# Altium schematic symbol library jlcpcb_2025_04_capacitors_extended_0402.schlib: 3594 symbols (part 13 of 20) (continued)
## GCM1555C1H3R5CA16D (continued)
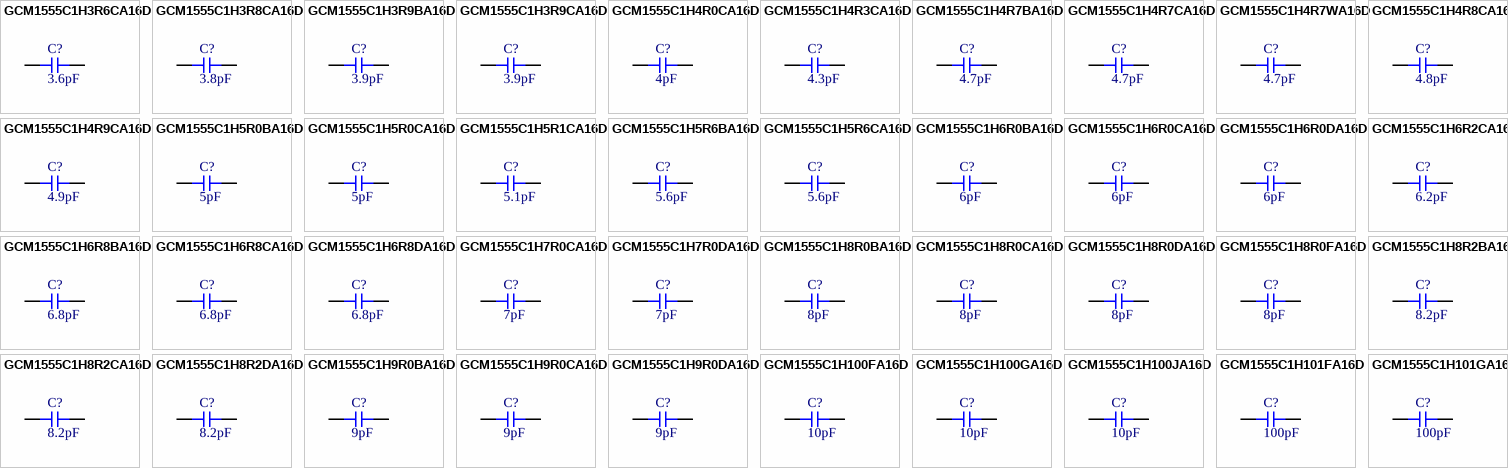
[diagram p58: symbols GCM1555C1H3R6CA16D to GCM1555C1H101GA16D]

## GCM1555C1H3R6CA16D
designator C?  Capacitance: 3.6pF  (hidden comment: *)
Capacitor, Ceramic (MLCC), 3.6pF, 50V, C0G, SMD 0402; Manufacturer: Murata Electronics; Manufacturer Part Number: GCM1555C1H3R6CA16D; Package Size: 0402; JLCPCB Basic Part: No; JLCPCB Part Number: C393673; Supplier 1: LCSC; Category: Capacitors - MLCC; Supplier Part Number 1: C393673; Voltage Rating: 50V; Temperature Coefficient: C0G; RoHS: Yes; ComponentLink1Description: Datasheet; ComponentLink1URL: https://wmsc.lcsc.com/wmsc/upload/file/pdf/v2/lcsc/1912111437_Murata-Electronics-GCM1555C1H3R6CA16D_C393673.pdf; ComponentLink2Description: JLCPCB Part URL; ComponentLink2URL: https://jlcpcb.com/partdetail/C393673; ComponentLink3Description: LCSC Part URL; ComponentLink3URL: https://lcsc.com/product-detail/Multilayer-Ceramic-Capacitors-MLCC---SMD-SMT_Murata-Electronics-Murata-Electronics-GCM1555C1H3R6CA16D_C393673.html
footprint CAP-0402 (0402 (1005M) Capacitor)
pins: 1, 2

## GCM1555C1H3R8CA16D
designator C?  Capacitance: 3.8pF  (hidden comment: *)
Capacitor, Ceramic (MLCC), 3.8pF, 50V, SMD 0402; Manufacturer: Murata Electronics; Manufacturer Part Number: GCM1555C1H3R8CA16D; Package Size: 0402; JLCPCB Basic Part: No; JLCPCB Part Number: C2189344; Supplier 1: LCSC; Category: Capacitors - MLCC; Supplier Part Number 1: C2189344; Voltage Rating: 50V; RoHS: Yes; ComponentLink1Description: Datasheet; ComponentLink1URL: https://wmsc.lcsc.com/wmsc/upload/file/pdf/v2/lcsc/2308111721_Murata-Electronics-GCM1555C1H3R8CA16D_C2189344.pdf; ComponentLink2Description: JLCPCB Part URL; ComponentLink2URL: https://jlcpcb.com/partdetail/C2189344; ComponentLink3Description: LCSC Part URL; ComponentLink3URL: https://lcsc.com/product-detail/Multilayer-Ceramic-Capacitors-MLCC---SMD-SMT_Murata-Electronics-Murata-Electronics-GCM1555C1H3R8CA16D_C2189344.html
footprint CAP-0402 (0402 (1005M) Capacitor)
pins: 1, 2

## GCM1555C1H3R9BA16D
designator C?  Capacitance: 3.9pF  (hidden comment: *)
Capacitor, Ceramic (MLCC), 3.9pF, 50V, C0G, SMD 0402; Manufacturer: Murata Electronics; Manufacturer Part Number: GCM1555C1H3R9BA16D; Package Size: 0402; JLCPCB Basic Part: No; JLCPCB Part Number: C126509; Supplier 1: LCSC; Category: Capacitors - MLCC; Supplier Part Number 1: C126509; Voltage Rating: 50V; Temperature Coefficient: C0G; RoHS: Yes; ComponentLink1Description: Datasheet; ComponentLink1URL: https://wmsc.lcsc.com/wmsc/upload/file/pdf/v2/lcsc/1811081516_Murata-Electronics-GCM1555C1H3R9BA16D_C126509.pdf; ComponentLink2Description: JLCPCB Part URL; ComponentLink2URL: https://jlcpcb.com/partdetail/C126509; ComponentLink3Description: LCSC Part URL; ComponentLink3URL: https://lcsc.com/product-detail/Multilayer-Ceramic-Capacitors-MLCC---SMD-SMT_Murata-Electronics-Murata-Electronics-GCM1555C1H3R9BA16D_C126509.html
footprint CAP-0402 (0402 (1005M) Capacitor)
pins: 1, 2

## GCM1555C1H3R9CA16D
designator C?  Capacitance: 3.9pF  (hidden comment: *)
Capacitor, Ceramic (MLCC), 3.9pF, 50V, C0G, SMD 0402; Manufacturer: Murata Electronics; Manufacturer Part Number: GCM1555C1H3R9CA16D; Package Size: 0402; JLCPCB Basic Part: No; JLCPCB Part Number: C126510; Supplier 1: LCSC; Category: Capacitors - MLCC; Supplier Part Number 1: C126510; Voltage Rating: 50V; Temperature Coefficient: C0G; RoHS: Yes; ComponentLink1Description: Datasheet; ComponentLink1URL: https://wmsc.lcsc.com/wmsc/upload/file/pdf/v2/lcsc/1811081516_Murata-Electronics-GCM1555C1H3R9CA16D_C126510.pdf; ComponentLink2Description: JLCPCB Part URL; ComponentLink2URL: https://jlcpcb.com/partdetail/C126510; ComponentLink3Description: LCSC Part URL; ComponentLink3URL: https://lcsc.com/product-detail/Multilayer-Ceramic-Capacitors-MLCC---SMD-SMT_Murata-Electronics-Murata-Electronics-GCM1555C1H3R9CA16D_C126510.html
footprint CAP-0402 (0402 (1005M) Capacitor)
pins: 1, 2

## GCM1555C1H4R0CA16D
designator C?  Capacitance: 4pF  (hidden comment: *)
Capacitor, Ceramic (MLCC), 4pF, 50V, C0G, SMD 0402; Manufacturer: Murata Electronics; Manufacturer Part Number: GCM1555C1H4R0CA16D; Package Size: 0402; JLCPCB Basic Part: No; JLCPCB Part Number: C161154; Supplier 1: LCSC; Category: Capacitors - MLCC; Supplier Part Number 1: C161154; Voltage Rating: 50V; Temperature Coefficient: C0G; RoHS: Yes; ComponentLink1Description: Datasheet; ComponentLink1URL: https://wmsc.lcsc.com/wmsc/upload/file/pdf/v2/lcsc/1811081550_Murata-Electronics-GCM1555C1H4R0CA16D_C161154.pdf; ComponentLink2Description: JLCPCB Part URL; ComponentLink2URL: https://jlcpcb.com/partdetail/C161154; ComponentLink3Description: LCSC Part URL; ComponentLink3URL: https://lcsc.com/product-detail/Multilayer-Ceramic-Capacitors-MLCC---SMD-SMT_Murata-Electronics-Murata-Electronics-GCM1555C1H4R0CA16D_C161154.html
footprint CAP-0402 (0402 (1005M) Capacitor)
pins: 1, 2

## GCM1555C1H4R3CA16D
designator C?  Capacitance: 4.3pF  (hidden comment: *)
Capacitor, Ceramic (MLCC), 4.3pF, 50V, SMD 0402; Manufacturer: Murata Electronics; Manufacturer Part Number: GCM1555C1H4R3CA16D; Package Size: 0402; JLCPCB Basic Part: No; JLCPCB Part Number: C2189468; Supplier 1: LCSC; Category: Capacitors - MLCC; Supplier Part Number 1: C2189468; Voltage Rating: 50V; RoHS: Yes; ComponentLink1Description: Datasheet; ComponentLink1URL: https://wmsc.lcsc.com/wmsc/upload/file/pdf/v2/lcsc/2308111721_Murata-Electronics-GCM1555C1H4R3CA16D_C2189468.pdf; ComponentLink2Description: JLCPCB Part URL; ComponentLink2URL: https://jlcpcb.com/partdetail/C2189468; ComponentLink3Description: LCSC Part URL; ComponentLink3URL: https://lcsc.com/product-detail/Multilayer-Ceramic-Capacitors-MLCC---SMD-SMT_Murata-Electronics-Murata-Electronics-GCM1555C1H4R3CA16D_C2189468.html
footprint CAP-0402 (0402 (1005M) Capacitor)
pins: 1, 2

## GCM1555C1H4R7BA16D
designator C?  Capacitance: 4.7pF  (hidden comment: *)
Capacitor, Ceramic (MLCC), 4.7pF, 50V, C0G, SMD 0402; Manufacturer: Murata Electronics; Manufacturer Part Number: GCM1555C1H4R7BA16D; Package Size: 0402; JLCPCB Basic Part: No; JLCPCB Part Number: C415377; Supplier 1: LCSC; Category: Capacitors - MLCC; Supplier Part Number 1: C415377; Voltage Rating: 50V; Temperature Coefficient: C0G; RoHS: Yes; ComponentLink1Description: Datasheet; ComponentLink1URL: https://wmsc.lcsc.com/wmsc/upload/file/pdf/v2/lcsc/1912111437_Murata-Electronics-GCM1555C1H4R7BA16D_C415377.pdf; ComponentLink2Description: JLCPCB Part URL; ComponentLink2URL: https://jlcpcb.com/partdetail/C415377; ComponentLink3Description: LCSC Part URL; ComponentLink3URL: https://lcsc.com/product-detail/Multilayer-Ceramic-Capacitors-MLCC---SMD-SMT_Murata-Electronics-Murata-Electronics-GCM1555C1H4R7BA16D_C415377.html
footprint CAP-0402 (0402 (1005M) Capacitor)
pins: 1, 2

## GCM1555C1H4R7CA16D
designator C?  Capacitance: 4.7pF  (hidden comment: *)
Capacitor, Ceramic (MLCC), 4.7pF, 50V, C0G, SMD 0402; Manufacturer: Murata Electronics; Manufacturer Part Number: GCM1555C1H4R7CA16D; Package Size: 0402; JLCPCB Basic Part: No; JLCPCB Part Number: C85856; Supplier 1: LCSC; Category: Capacitors - MLCC; Supplier Part Number 1: C85856; Voltage Rating: 50V; Temperature Coefficient: C0G; RoHS: Yes; ComponentLink1Description: Datasheet; ComponentLink1URL: https://wmsc.lcsc.com/wmsc/upload/file/pdf/v2/lcsc/2304140030_Murata-Electronics-GCM1555C1H4R7CA16D_C85856.pdf; ComponentLink2Description: JLCPCB Part URL; ComponentLink2URL: https://jlcpcb.com/partdetail/C85856; ComponentLink3Description: LCSC Part URL; ComponentLink3URL: https://lcsc.com/product-detail/Multilayer-Ceramic-Capacitors-MLCC---SMD-SMT_Murata-Electronics-Murata-Electronics-GCM1555C1H4R7CA16D_C85856.html
footprint CAP-0402 (0402 (1005M) Capacitor)
pins: 1, 2

## GCM1555C1H4R7WA16D
designator C?  Capacitance: 4.7pF  (hidden comment: *)
Capacitor, Ceramic (MLCC), 4.7pF, 50V, C0G, SMD 0402; Manufacturer: Murata Electronics; Manufacturer Part Number: GCM1555C1H4R7WA16D; Package Size: 0402; JLCPCB Basic Part: No; JLCPCB Part Number: C437442; Supplier 1: LCSC; Category: Capacitors - MLCC; Supplier Part Number 1: C437442; Voltage Rating: 50V; Temperature Coefficient: C0G; RoHS: Yes; ComponentLink1Description: Datasheet; ComponentLink1URL: https://wmsc.lcsc.com/wmsc/upload/file/pdf/v2/lcsc/2304140030_Murata-Electronics-GCM1555C1H4R7WA16D_C437442.pdf; ComponentLink2Description: JLCPCB Part URL; ComponentLink2URL: https://jlcpcb.com/partdetail/C437442; ComponentLink3Description: LCSC Part URL; ComponentLink3URL: https://lcsc.com/product-detail/Multilayer-Ceramic-Capacitors-MLCC---SMD-SMT_Murata-Electronics-Murata-Electronics-GCM1555C1H4R7WA16D_C437442.html
footprint CAP-0402 (0402 (1005M) Capacitor)
pins: 1, 2

## GCM1555C1H4R8CA16D
designator C?  Capacitance: 4.8pF  (hidden comment: *)
Capacitor, Ceramic (MLCC), 4.8pF, 50V, SMD 0402; Manufacturer: Murata Electronics; Manufacturer Part Number: GCM1555C1H4R8CA16D; Package Size: 0402; JLCPCB Basic Part: No; JLCPCB Part Number: C2189341; Supplier 1: LCSC; Category: Capacitors - MLCC; Supplier Part Number 1: C2189341; Voltage Rating: 50V; RoHS: Yes; ComponentLink1Description: Datasheet; ComponentLink1URL: https://wmsc.lcsc.com/wmsc/upload/file/pdf/v2/lcsc/2308111721_Murata-Electronics-GCM1555C1H4R8CA16D_C2189341.pdf; ComponentLink2Description: JLCPCB Part URL; ComponentLink2URL: https://jlcpcb.com/partdetail/C2189341; ComponentLink3Description: LCSC Part URL; ComponentLink3URL: https://lcsc.com/product-detail/Multilayer-Ceramic-Capacitors-MLCC---SMD-SMT_Murata-Electronics-Murata-Electronics-GCM1555C1H4R8CA16D_C2189341.html
footprint CAP-0402 (0402 (1005M) Capacitor)
pins: 1, 2

## GCM1555C1H4R9CA16D
designator C?  Capacitance: 4.9pF  (hidden comment: *)
Capacitor, Ceramic (MLCC), 4.9pF, 50V, C0G, SMD 0402; Manufacturer: Murata Electronics; Manufacturer Part Number: GCM1555C1H4R9CA16D; Package Size: 0402; JLCPCB Basic Part: No; JLCPCB Part Number: C2941936; Supplier 1: LCSC; Category: Capacitors - MLCC; Supplier Part Number 1: C2941936; Voltage Rating: 50V; Temperature Coefficient: C0G; RoHS: Yes; ComponentLink1Description: Datasheet; ComponentLink1URL: https://wmsc.lcsc.com/wmsc/upload/file/pdf/v2/lcsc/2201121900_Murata-Electronics-GCM1555C1H4R9CA16D_C2941936.pdf; ComponentLink2Description: JLCPCB Part URL; ComponentLink2URL: https://jlcpcb.com/partdetail/C2941936; ComponentLink3Description: LCSC Part URL; ComponentLink3URL: https://lcsc.com/product-detail/Multilayer-Ceramic-Capacitors-MLCC---SMD-SMT_Murata-Electronics-Murata-Electronics-GCM1555C1H4R9CA16D_C2941936.html
footprint CAP-0402 (0402 (1005M) Capacitor)
pins: 1, 2

## GCM1555C1H5R0BA16D
designator C?  Capacitance: 5pF  (hidden comment: *)
Capacitor, Ceramic (MLCC), 5pF, null, SMD 0402; Manufacturer: Murata Electronics; Manufacturer Part Number: GCM1555C1H5R0BA16D; Package Size: 0402; JLCPCB Basic Part: No; JLCPCB Part Number: C368602; Supplier 1: LCSC; Category: Capacitors - MLCC; Supplier Part Number 1: C368602; Voltage Rating: null; RoHS: Yes; ComponentLink1Description: Datasheet; ComponentLink1URL: https://wmsc.lcsc.com/wmsc/upload/file/pdf/v2/lcsc/2009141233_Murata-Electronics-GCM1555C1H5R0BA16D_C368602.pdf; ComponentLink2Description: JLCPCB Part URL; ComponentLink2URL: https://jlcpcb.com/partdetail/C368602; ComponentLink3Description: LCSC Part URL; ComponentLink3URL: https://lcsc.com/product-detail/Multilayer-Ceramic-Capacitors-MLCC---SMD-SMT_Murata-Electronics-Murata-Electronics-GCM1555C1H5R0BA16D_C368602.html
footprint CAP-0402 (0402 (1005M) Capacitor)
pins: 1, 2

## GCM1555C1H5R0CA16D
designator C?  Capacitance: 5pF  (hidden comment: *)
Capacitor, Ceramic (MLCC), 5pF, 50V, C0G, SMD 0402; Manufacturer: Murata Electronics; Manufacturer Part Number: GCM1555C1H5R0CA16D; Package Size: 0402; JLCPCB Basic Part: No; JLCPCB Part Number: C126513; Supplier 1: LCSC; Category: Capacitors - MLCC; Supplier Part Number 1: C126513; Voltage Rating: 50V; Temperature Coefficient: C0G; RoHS: Yes; ComponentLink1Description: Datasheet; ComponentLink1URL: https://wmsc.lcsc.com/wmsc/upload/file/pdf/v2/lcsc/1811081517_Murata-Electronics-GCM1555C1H5R0CA16D_C126513.pdf; ComponentLink2Description: JLCPCB Part URL; ComponentLink2URL: https://jlcpcb.com/partdetail/C126513; ComponentLink3Description: LCSC Part URL; ComponentLink3URL: https://lcsc.com/product-detail/Multilayer-Ceramic-Capacitors-MLCC---SMD-SMT_Murata-Electronics-Murata-Electronics-GCM1555C1H5R0CA16D_C126513.html
footprint CAP-0402 (0402 (1005M) Capacitor)
pins: 1, 2

## GCM1555C1H5R1CA16D
designator C?  Capacitance: 5.1pF  (hidden comment: *)
Capacitor, Ceramic (MLCC), 5.1pF, 50V, C0G, SMD 0402; Manufacturer: Murata Electronics; Manufacturer Part Number: GCM1555C1H5R1CA16D; Package Size: 0402; JLCPCB Basic Part: No; JLCPCB Part Number: C710655; Supplier 1: LCSC; Category: Capacitors - MLCC; Supplier Part Number 1: C710655; Voltage Rating: 50V; Temperature Coefficient: C0G; RoHS: Yes; ComponentLink1Description: Datasheet; ComponentLink1URL: https://wmsc.lcsc.com/wmsc/upload/file/pdf/v2/lcsc/2201111430_Murata-Electronics-GCM1555C1H5R1CA16D_C710655.pdf; ComponentLink2Description: JLCPCB Part URL; ComponentLink2URL: https://jlcpcb.com/partdetail/C710655; ComponentLink3Description: LCSC Part URL; ComponentLink3URL: https://lcsc.com/product-detail/Multilayer-Ceramic-Capacitors-MLCC---SMD-SMT_Murata-Electronics-Murata-Electronics-GCM1555C1H5R1CA16D_C710655.html
footprint CAP-0402 (0402 (1005M) Capacitor)
pins: 1, 2

## GCM1555C1H5R6BA16D
designator C?  Capacitance: 5.6pF  (hidden comment: *)
Capacitor, Ceramic (MLCC), 5.6pF, 50V, C0G, SMD 0402; Manufacturer: Murata Electronics; Manufacturer Part Number: GCM1555C1H5R6BA16D; Package Size: 0402; JLCPCB Basic Part: No; JLCPCB Part Number: C415376; Supplier 1: LCSC; Category: Capacitors - MLCC; Supplier Part Number 1: C415376; Voltage Rating: 50V; Temperature Coefficient: C0G; RoHS: Yes; ComponentLink1Description: Datasheet; ComponentLink1URL: https://wmsc.lcsc.com/wmsc/upload/file/pdf/v2/lcsc/2304140030_Murata-Electronics-GCM1555C1H5R6BA16D_C415376.pdf; ComponentLink2Description: JLCPCB Part URL; ComponentLink2URL: https://jlcpcb.com/partdetail/C415376; ComponentLink3Description: LCSC Part URL; ComponentLink3URL: https://lcsc.com/product-detail/Multilayer-Ceramic-Capacitors-MLCC---SMD-SMT_Murata-Electronics-Murata-Electronics-GCM1555C1H5R6BA16D_C415376.html
footprint CAP-0402 (0402 (1005M) Capacitor)
pins: 1, 2

## GCM1555C1H5R6CA16D
designator C?  Capacitance: 5.6pF  (hidden comment: *)
Capacitor, Ceramic (MLCC), 5.6pF, 50V, C0G, SMD 0402; Manufacturer: Murata Electronics; Manufacturer Part Number: GCM1555C1H5R6CA16D; Package Size: 0402; JLCPCB Basic Part: No; JLCPCB Part Number: C161155; Supplier 1: LCSC; Category: Capacitors - MLCC; Supplier Part Number 1: C161155; Voltage Rating: 50V; Temperature Coefficient: C0G; RoHS: Yes; ComponentLink1Description: Datasheet; ComponentLink1URL: https://wmsc.lcsc.com/wmsc/upload/file/pdf/v2/lcsc/1811081550_Murata-Electronics-GCM1555C1H5R6CA16D_C161155.pdf; ComponentLink2Description: JLCPCB Part URL; ComponentLink2URL: https://jlcpcb.com/partdetail/C161155; ComponentLink3Description: LCSC Part URL; ComponentLink3URL: https://lcsc.com/product-detail/Multilayer-Ceramic-Capacitors-MLCC---SMD-SMT_Murata-Electronics-Murata-Electronics-GCM1555C1H5R6CA16D_C161155.html
footprint CAP-0402 (0402 (1005M) Capacitor)
pins: 1, 2

## GCM1555C1H6R0BA16D
designator C?  Capacitance: 6pF  (hidden comment: *)
Capacitor, Ceramic (MLCC), 6pF, 50V, C0G, SMD 0402; Manufacturer: Murata Electronics; Manufacturer Part Number: GCM1555C1H6R0BA16D; Package Size: 0402; JLCPCB Basic Part: No; JLCPCB Part Number: C437443; Supplier 1: LCSC; Category: Capacitors - MLCC; Supplier Part Number 1: C437443; Voltage Rating: 50V; Temperature Coefficient: C0G; RoHS: Yes; ComponentLink1Description: Datasheet; ComponentLink1URL: https://wmsc.lcsc.com/wmsc/upload/file/pdf/v2/lcsc/2304140030_Murata-Electronics-GCM1555C1H6R0BA16D_C437443.pdf; ComponentLink2Description: JLCPCB Part URL; ComponentLink2URL: https://jlcpcb.com/partdetail/C437443; ComponentLink3Description: LCSC Part URL; ComponentLink3URL: https://lcsc.com/product-detail/Multilayer-Ceramic-Capacitors-MLCC---SMD-SMT_Murata-Electronics-Murata-Electronics-GCM1555C1H6R0BA16D_C437443.html
footprint CAP-0402 (0402 (1005M) Capacitor)
pins: 1, 2

## GCM1555C1H6R0CA16D
designator C?  Capacitance: 6pF  (hidden comment: *)
Capacitor, Ceramic (MLCC), 6pF, 50V, C0G, SMD 0402; Manufacturer: Murata Electronics; Manufacturer Part Number: GCM1555C1H6R0CA16D; Package Size: 0402; JLCPCB Basic Part: No; JLCPCB Part Number: C363933; Supplier 1: LCSC; Category: Capacitors - MLCC; Supplier Part Number 1: C363933; Voltage Rating: 50V; Temperature Coefficient: C0G; RoHS: Yes; ComponentLink1Description: Datasheet; ComponentLink1URL: https://wmsc.lcsc.com/wmsc/upload/file/pdf/v2/lcsc/2304140030_Murata-Electronics-GCM1555C1H6R0CA16D_C363933.pdf; ComponentLink2Description: JLCPCB Part URL; ComponentLink2URL: https://jlcpcb.com/partdetail/C363933; ComponentLink3Description: LCSC Part URL; ComponentLink3URL: https://lcsc.com/product-detail/Multilayer-Ceramic-Capacitors-MLCC---SMD-SMT_Murata-Electronics-Murata-Electronics-GCM1555C1H6R0CA16D_C363933.html
footprint CAP-0402 (0402 (1005M) Capacitor)
pins: 1, 2

## GCM1555C1H6R0DA16D
designator C?  Capacitance: 6pF  (hidden comment: *)
Capacitor, Ceramic (MLCC), 6pF, 50V, C0G, SMD 0402; Manufacturer: Murata Electronics; Manufacturer Part Number: GCM1555C1H6R0DA16D; Package Size: 0402; JLCPCB Basic Part: No; JLCPCB Part Number: C437444; Supplier 1: LCSC; Category: Capacitors - MLCC; Supplier Part Number 1: C437444; Voltage Rating: 50V; Temperature Coefficient: C0G; RoHS: Yes; ComponentLink1Description: Datasheet; ComponentLink1URL: https://wmsc.lcsc.com/wmsc/upload/file/pdf/v2/lcsc/2304140030_Murata-Electronics-GCM1555C1H6R0DA16D_C437444.pdf; ComponentLink2Description: JLCPCB Part URL; ComponentLink2URL: https://jlcpcb.com/partdetail/C437444; ComponentLink3Description: LCSC Part URL; ComponentLink3URL: https://lcsc.com/product-detail/Multilayer-Ceramic-Capacitors-MLCC---SMD-SMT_Murata-Electronics-Murata-Electronics-GCM1555C1H6R0DA16D_C437444.html
footprint CAP-0402 (0402 (1005M) Capacitor)
pins: 1, 2

## GCM1555C1H6R2CA16D
designator C?  Capacitance: 6.2pF  (hidden comment: *)
Capacitor, Ceramic (MLCC), 6.2pF, 50V, C0G, SMD 0402; Manufacturer: Murata Electronics; Manufacturer Part Number: GCM1555C1H6R2CA16D; Package Size: 0402; JLCPCB Basic Part: No; JLCPCB Part Number: C2941947; Supplier 1: LCSC; Category: Capacitors - MLCC; Supplier Part Number 1: C2941947; Voltage Rating: 50V; Temperature Coefficient: C0G; RoHS: Yes; ComponentLink1Description: Datasheet; ComponentLink1URL: https://wmsc.lcsc.com/wmsc/upload/file/pdf/v2/lcsc/2201121900_Murata-Electronics-GCM1555C1H6R2CA16D_C2941947.pdf; ComponentLink2Description: JLCPCB Part URL; ComponentLink2URL: https://jlcpcb.com/partdetail/C2941947; ComponentLink3Description: LCSC Part URL; ComponentLink3URL: https://lcsc.com/product-detail/Multilayer-Ceramic-Capacitors-MLCC---SMD-SMT_Murata-Electronics-Murata-Electronics-GCM1555C1H6R2CA16D_C2941947.html
footprint CAP-0402 (0402 (1005M) Capacitor)
pins: 1, 2

## GCM1555C1H6R8BA16D
designator C?  Capacitance: 6.8pF  (hidden comment: *)
Capacitor, Ceramic (MLCC), 6.8pF, 50V, C0G, SMD 0402; Manufacturer: Murata Electronics; Manufacturer Part Number: GCM1555C1H6R8BA16D; Package Size: 0402; JLCPCB Basic Part: No; JLCPCB Part Number: C354360; Supplier 1: LCSC; Category: Capacitors - MLCC; Supplier Part Number 1: C354360; Voltage Rating: 50V; Temperature Coefficient: C0G; RoHS: Yes; ComponentLink1Description: Datasheet; ComponentLink1URL: https://wmsc.lcsc.com/wmsc/upload/file/pdf/v2/lcsc/2304140030_Murata-Electronics-GCM1555C1H6R8BA16D_C354360.pdf; ComponentLink2Description: JLCPCB Part URL; ComponentLink2URL: https://jlcpcb.com/partdetail/C354360; ComponentLink3Description: LCSC Part URL; ComponentLink3URL: https://lcsc.com/product-detail/Multilayer-Ceramic-Capacitors-MLCC---SMD-SMT_Murata-Electronics-Murata-Electronics-GCM1555C1H6R8BA16D_C354360.html
footprint CAP-0402 (0402 (1005M) Capacitor)
pins: 1, 2

## GCM1555C1H6R8CA16D
designator C?  Capacitance: 6.8pF  (hidden comment: *)
Capacitor, Ceramic (MLCC), 6.8pF, 50V, C0G, SMD 0402; Manufacturer: Murata Electronics; Manufacturer Part Number: GCM1555C1H6R8CA16D; Package Size: 0402; JLCPCB Basic Part: No; JLCPCB Part Number: C161157; Supplier 1: LCSC; Category: Capacitors - MLCC; Supplier Part Number 1: C161157; Voltage Rating: 50V; Temperature Coefficient: C0G; RoHS: Yes; ComponentLink1Description: Datasheet; ComponentLink1URL: https://wmsc.lcsc.com/wmsc/upload/file/pdf/v2/lcsc/2304140030_Murata-Electronics-GCM1555C1H6R8CA16D_C161157.pdf; ComponentLink2Description: JLCPCB Part URL; ComponentLink2URL: https://jlcpcb.com/partdetail/C161157; ComponentLink3Description: LCSC Part URL; ComponentLink3URL: https://lcsc.com/product-detail/Multilayer-Ceramic-Capacitors-MLCC---SMD-SMT_Murata-Electronics-Murata-Electronics-GCM1555C1H6R8CA16D_C161157.html
footprint CAP-0402 (0402 (1005M) Capacitor)
pins: 1, 2

## GCM1555C1H6R8DA16D
designator C?  Capacitance: 6.8pF  (hidden comment: *)
Capacitor, Ceramic (MLCC), 6.8pF, 50V, C0G, SMD 0402; Manufacturer: Murata Electronics; Manufacturer Part Number: GCM1555C1H6R8DA16D; Package Size: 0402; JLCPCB Basic Part: No; JLCPCB Part Number: C437445; Supplier 1: LCSC; Category: Capacitors - MLCC; Supplier Part Number 1: C437445; Voltage Rating: 50V; Temperature Coefficient: C0G; RoHS: Yes; ComponentLink1Description: Datasheet; ComponentLink1URL: https://wmsc.lcsc.com/wmsc/upload/file/pdf/v2/lcsc/2304140030_Murata-Electronics-GCM1555C1H6R8DA16D_C437445.pdf; ComponentLink2Description: JLCPCB Part URL; ComponentLink2URL: https://jlcpcb.com/partdetail/C437445; ComponentLink3Description: LCSC Part URL; ComponentLink3URL: https://lcsc.com/product-detail/Multilayer-Ceramic-Capacitors-MLCC---SMD-SMT_Murata-Electronics-Murata-Electronics-GCM1555C1H6R8DA16D_C437445.html
footprint CAP-0402 (0402 (1005M) Capacitor)
pins: 1, 2

## GCM1555C1H7R0CA16D
designator C?  Capacitance: 7pF  (hidden comment: *)
Capacitor, Ceramic (MLCC), 7pF, 50V, C0G, SMD 0402; Manufacturer: Murata Electronics; Manufacturer Part Number: GCM1555C1H7R0CA16D; Package Size: 0402; JLCPCB Basic Part: No; JLCPCB Part Number: C363934; Supplier 1: LCSC; Category: Capacitors - MLCC; Supplier Part Number 1: C363934; Voltage Rating: 50V; Temperature Coefficient: C0G; RoHS: Yes; ComponentLink1Description: Datasheet; ComponentLink1URL: https://wmsc.lcsc.com/wmsc/upload/file/pdf/v2/lcsc/2304140030_Murata-Electronics-GCM1555C1H7R0CA16D_C363934.pdf; ComponentLink2Description: JLCPCB Part URL; ComponentLink2URL: https://jlcpcb.com/partdetail/C363934; ComponentLink3Description: LCSC Part URL; ComponentLink3URL: https://lcsc.com/product-detail/Multilayer-Ceramic-Capacitors-MLCC---SMD-SMT_Murata-Electronics-Murata-Electronics-GCM1555C1H7R0CA16D_C363934.html
footprint CAP-0402 (0402 (1005M) Capacitor)
pins: 1, 2

## GCM1555C1H7R0DA16D
designator C?  Capacitance: 7pF  (hidden comment: *)
Capacitor, Ceramic (MLCC), 7pF, 50V, C0G, SMD 0402; Manufacturer: Murata Electronics; Manufacturer Part Number: GCM1555C1H7R0DA16D; Package Size: 0402; JLCPCB Basic Part: No; JLCPCB Part Number: C161158; Supplier 1: LCSC; Category: Capacitors - MLCC; Supplier Part Number 1: C161158; Voltage Rating: 50V; Temperature Coefficient: C0G; RoHS: Yes; ComponentLink1Description: Datasheet; ComponentLink1URL: https://wmsc.lcsc.com/wmsc/upload/file/pdf/v2/lcsc/1811081550_Murata-Electronics-GCM1555C1H7R0DA16D_C161158.pdf; ComponentLink2Description: JLCPCB Part URL; ComponentLink2URL: https://jlcpcb.com/partdetail/C161158; ComponentLink3Description: LCSC Part URL; ComponentLink3URL: https://lcsc.com/product-detail/Multilayer-Ceramic-Capacitors-MLCC---SMD-SMT_Murata-Electronics-Murata-Electronics-GCM1555C1H7R0DA16D_C161158.html
footprint CAP-0402 (0402 (1005M) Capacitor)
pins: 1, 2

## GCM1555C1H8R0BA16D
designator C?  Capacitance: 8pF  (hidden comment: *)
Capacitor, Ceramic (MLCC), 8pF, 50V, C0G, SMD 0402; Manufacturer: Murata Electronics; Manufacturer Part Number: GCM1555C1H8R0BA16D; Package Size: 0402; JLCPCB Basic Part: No; JLCPCB Part Number: C126516; Supplier 1: LCSC; Category: Capacitors - MLCC; Supplier Part Number 1: C126516; Voltage Rating: 50V; Temperature Coefficient: C0G; RoHS: Yes; ComponentLink1Description: Datasheet; ComponentLink1URL: https://wmsc.lcsc.com/wmsc/upload/file/pdf/v2/lcsc/1811081533_Murata-Electronics-GCM1555C1H8R0BA16D_C126516.pdf; ComponentLink2Description: JLCPCB Part URL; ComponentLink2URL: https://jlcpcb.com/partdetail/C126516; ComponentLink3Description: LCSC Part URL; ComponentLink3URL: https://lcsc.com/product-detail/Multilayer-Ceramic-Capacitors-MLCC---SMD-SMT_Murata-Electronics-Murata-Electronics-GCM1555C1H8R0BA16D_C126516.html
footprint CAP-0402 (0402 (1005M) Capacitor)
pins: 1, 2

## GCM1555C1H8R0CA16D
designator C?  Capacitance: 8pF  (hidden comment: *)
Capacitor, Ceramic (MLCC), 8pF, 50V, C0G, SMD 0402; Manufacturer: Murata Electronics; Manufacturer Part Number: GCM1555C1H8R0CA16D; Package Size: 0402; JLCPCB Basic Part: No; JLCPCB Part Number: C161160; Supplier 1: LCSC; Category: Capacitors - MLCC; Supplier Part Number 1: C161160; Voltage Rating: 50V; Temperature Coefficient: C0G; RoHS: Yes; ComponentLink1Description: Datasheet; ComponentLink1URL: https://wmsc.lcsc.com/wmsc/upload/file/pdf/v2/lcsc/1811081547_Murata-Electronics-GCM1555C1H8R0CA16D_C161160.pdf; ComponentLink2Description: JLCPCB Part URL; ComponentLink2URL: https://jlcpcb.com/partdetail/C161160; ComponentLink3Description: LCSC Part URL; ComponentLink3URL: https://lcsc.com/product-detail/Multilayer-Ceramic-Capacitors-MLCC---SMD-SMT_Murata-Electronics-Murata-Electronics-GCM1555C1H8R0CA16D_C161160.html
footprint CAP-0402 (0402 (1005M) Capacitor)
pins: 1, 2

## GCM1555C1H8R0DA16D
designator C?  Capacitance: 8pF  (hidden comment: *)
Capacitor, Ceramic (MLCC), 8pF, 50V, C0G, SMD 0402; Manufacturer: Murata Electronics; Manufacturer Part Number: GCM1555C1H8R0DA16D; Package Size: 0402; JLCPCB Basic Part: No; JLCPCB Part Number: C126517; Supplier 1: LCSC; Category: Capacitors - MLCC; Supplier Part Number 1: C126517; Voltage Rating: 50V; Temperature Coefficient: C0G; RoHS: Yes; ComponentLink1Description: Datasheet; ComponentLink1URL: https://wmsc.lcsc.com/wmsc/upload/file/pdf/v2/lcsc/1811081510_Murata-Electronics-GCM1555C1H8R0DA16D_C126517.pdf; ComponentLink2Description: JLCPCB Part URL; ComponentLink2URL: https://jlcpcb.com/partdetail/C126517; ComponentLink3Description: LCSC Part URL; ComponentLink3URL: https://lcsc.com/product-detail/Multilayer-Ceramic-Capacitors-MLCC---SMD-SMT_Murata-Electronics-Murata-Electronics-GCM1555C1H8R0DA16D_C126517.html
footprint CAP-0402 (0402 (1005M) Capacitor)
pins: 1, 2

## GCM1555C1H8R0FA16D
designator C?  Capacitance: 8pF  (hidden comment: *)
Capacitor, Ceramic (MLCC), 8pF, ±1%, 50V, C0G, ±1%, SMD 0402; Manufacturer: Murata Electronics; Manufacturer Part Number: GCM1555C1H8R0FA16D; Package Size: 0402; JLCPCB Basic Part: No; JLCPCB Part Number: C1864375; Supplier 1: LCSC; Category: Capacitors - MLCC; Supplier Part Number 1: C1864375; Tolerance: ±1%; Voltage Rating: 50V; Temperature Coefficient: C0G; RoHS: Yes; ComponentLink1Description: Datasheet; ComponentLink1URL: https://wmsc.lcsc.com/wmsc/upload/file/pdf/v2/lcsc/2201111430_Murata-Electronics-GCM1555C1H8R0FA16D_C1864375.pdf; ComponentLink2Description: JLCPCB Part URL; ComponentLink2URL: https://jlcpcb.com/partdetail/C1864375; ComponentLink3Description: LCSC Part URL; ComponentLink3URL: https://lcsc.com/product-detail/Multilayer-Ceramic-Capacitors-MLCC---SMD-SMT_Murata-Electronics-Murata-Electronics-GCM1555C1H8R0FA16D_C1864375.html
footprint CAP-0402 (0402 (1005M) Capacitor)
pins: 1, 2

## GCM1555C1H8R2BA16D
designator C?  Capacitance: 8.2pF  (hidden comment: *)
Capacitor, Ceramic (MLCC), 8.2pF, 50V, C0G, SMD 0402; Manufacturer: Murata Electronics; Manufacturer Part Number: GCM1555C1H8R2BA16D; Package Size: 0402; JLCPCB Basic Part: No; JLCPCB Part Number: C126518; Supplier 1: LCSC; Category: Capacitors - MLCC; Supplier Part Number 1: C126518; Voltage Rating: 50V; Temperature Coefficient: C0G; RoHS: Yes; ComponentLink1Description: Datasheet; ComponentLink1URL: https://wmsc.lcsc.com/wmsc/upload/file/pdf/v2/lcsc/1811081516_Murata-Electronics-GCM1555C1H8R2BA16D_C126518.pdf; ComponentLink2Description: JLCPCB Part URL; ComponentLink2URL: https://jlcpcb.com/partdetail/C126518; ComponentLink3Description: LCSC Part URL; ComponentLink3URL: https://lcsc.com/product-detail/Multilayer-Ceramic-Capacitors-MLCC---SMD-SMT_Murata-Electronics-Murata-Electronics-GCM1555C1H8R2BA16D_C126518.html
footprint CAP-0402 (0402 (1005M) Capacitor)
pins: 1, 2

## GCM1555C1H8R2CA16D
designator C?  Capacitance: 8.2pF  (hidden comment: *)
Capacitor, Ceramic (MLCC), 8.2pF, 50V, C0G, SMD 0402; Manufacturer: Murata Electronics; Manufacturer Part Number: GCM1555C1H8R2CA16D; Package Size: 0402; JLCPCB Basic Part: No; JLCPCB Part Number: C393675; Supplier 1: LCSC; Category: Capacitors - MLCC; Supplier Part Number 1: C393675; Voltage Rating: 50V; Temperature Coefficient: C0G; RoHS: Yes; ComponentLink1Description: Datasheet; ComponentLink1URL: https://wmsc.lcsc.com/wmsc/upload/file/pdf/v2/lcsc/1912111437_Murata-Electronics-GCM1555C1H8R2CA16D_C393675.pdf; ComponentLink2Description: JLCPCB Part URL; ComponentLink2URL: https://jlcpcb.com/partdetail/C393675; ComponentLink3Description: LCSC Part URL; ComponentLink3URL: https://lcsc.com/product-detail/Multilayer-Ceramic-Capacitors-MLCC---SMD-SMT_Murata-Electronics-Murata-Electronics-GCM1555C1H8R2CA16D_C393675.html
footprint CAP-0402 (0402 (1005M) Capacitor)
pins: 1, 2

## GCM1555C1H8R2DA16D
designator C?  Capacitance: 8.2pF  (hidden comment: *)
Capacitor, Ceramic (MLCC), 8.2pF, 50V, C0G, SMD 0402; Manufacturer: Murata Electronics; Manufacturer Part Number: GCM1555C1H8R2DA16D; Package Size: 0402; JLCPCB Basic Part: No; JLCPCB Part Number: C393674; Supplier 1: LCSC; Category: Capacitors - MLCC; Supplier Part Number 1: C393674; Voltage Rating: 50V; Temperature Coefficient: C0G; RoHS: Yes; ComponentLink1Description: Datasheet; ComponentLink1URL: https://wmsc.lcsc.com/wmsc/upload/file/pdf/v2/lcsc/1912111437_Murata-Electronics-GCM1555C1H8R2DA16D_C393674.pdf; ComponentLink2Description: JLCPCB Part URL; ComponentLink2URL: https://jlcpcb.com/partdetail/C393674; ComponentLink3Description: LCSC Part URL; ComponentLink3URL: https://lcsc.com/product-detail/Multilayer-Ceramic-Capacitors-MLCC---SMD-SMT_Murata-Electronics-Murata-Electronics-GCM1555C1H8R2DA16D_C393674.html
footprint CAP-0402 (0402 (1005M) Capacitor)
pins: 1, 2

## GCM1555C1H9R0BA16D
designator C?  Capacitance: 9pF  (hidden comment: *)
Capacitor, Ceramic (MLCC), 9pF, 50V, C0G, SMD 0402; Manufacturer: Murata Electronics; Manufacturer Part Number: GCM1555C1H9R0BA16D; Package Size: 0402; JLCPCB Basic Part: No; JLCPCB Part Number: C1864583; Supplier 1: LCSC; Category: Capacitors - MLCC; Supplier Part Number 1: C1864583; Voltage Rating: 50V; Temperature Coefficient: C0G; RoHS: Yes; ComponentLink1Description: Datasheet; ComponentLink1URL: https://wmsc.lcsc.com/wmsc/upload/file/pdf/v2/lcsc/2201271830_Murata-Electronics-GCM1555C1H9R0BA16D_C1864583.pdf; ComponentLink2Description: JLCPCB Part URL; ComponentLink2URL: https://jlcpcb.com/partdetail/C1864583; ComponentLink3Description: LCSC Part URL; ComponentLink3URL: https://lcsc.com/product-detail/Multilayer-Ceramic-Capacitors-MLCC---SMD-SMT_Murata-Electronics-Murata-Electronics-GCM1555C1H9R0BA16D_C1864583.html
footprint CAP-0402 (0402 (1005M) Capacitor)
pins: 1, 2

## GCM1555C1H9R0CA16D
designator C?  Capacitance: 9pF  (hidden comment: *)
Capacitor, Ceramic (MLCC), 9pF, 50V, C0G, SMD 0402; Manufacturer: Murata Electronics; Manufacturer Part Number: GCM1555C1H9R0CA16D; Package Size: 0402; JLCPCB Basic Part: No; JLCPCB Part Number: C126519; Supplier 1: LCSC; Category: Capacitors - MLCC; Supplier Part Number 1: C126519; Voltage Rating: 50V; Temperature Coefficient: C0G; RoHS: Yes; ComponentLink1Description: Datasheet; ComponentLink1URL: https://wmsc.lcsc.com/wmsc/upload/file/pdf/v2/lcsc/1811081510_Murata-Electronics-GCM1555C1H9R0CA16D_C126519.pdf; ComponentLink2Description: JLCPCB Part URL; ComponentLink2URL: https://jlcpcb.com/partdetail/C126519; ComponentLink3Description: LCSC Part URL; ComponentLink3URL: https://lcsc.com/product-detail/Multilayer-Ceramic-Capacitors-MLCC---SMD-SMT_Murata-Electronics-Murata-Electronics-GCM1555C1H9R0CA16D_C126519.html
footprint CAP-0402 (0402 (1005M) Capacitor)
pins: 1, 2

## GCM1555C1H9R0DA16D
designator C?  Capacitance: 9pF  (hidden comment: *)
Capacitor, Ceramic (MLCC), 9pF, 50V, C0G, SMD 0402; Manufacturer: Murata Electronics; Manufacturer Part Number: GCM1555C1H9R0DA16D; Package Size: 0402; JLCPCB Basic Part: No; JLCPCB Part Number: C437446; Supplier 1: LCSC; Category: Capacitors - MLCC; Supplier Part Number 1: C437446; Voltage Rating: 50V; Temperature Coefficient: C0G; RoHS: Yes; ComponentLink1Description: Datasheet; ComponentLink1URL: https://wmsc.lcsc.com/wmsc/upload/file/pdf/v2/lcsc/2304140030_Murata-Electronics-GCM1555C1H9R0DA16D_C437446.pdf; ComponentLink2Description: JLCPCB Part URL; ComponentLink2URL: https://jlcpcb.com/partdetail/C437446; ComponentLink3Description: LCSC Part URL; ComponentLink3URL: https://lcsc.com/product-detail/Multilayer-Ceramic-Capacitors-MLCC---SMD-SMT_Murata-Electronics-Murata-Electronics-GCM1555C1H9R0DA16D_C437446.html
footprint CAP-0402 (0402 (1005M) Capacitor)
pins: 1, 2

## GCM1555C1H100FA16D
designator C?  Capacitance: 10pF  (hidden comment: *)
Capacitor, Ceramic (MLCC), 10pF, ±1%, 50V, C0G, ±1%, SMD 0402; Manufacturer: Murata Electronics; Manufacturer Part Number: GCM1555C1H100FA16D; Package Size: 0402; JLCPCB Basic Part: No; JLCPCB Part Number: C161145; Supplier 1: LCSC; Category: Capacitors - MLCC; Supplier Part Number 1: C161145; Tolerance: ±1%; Voltage Rating: 50V; Temperature Coefficient: C0G; RoHS: Yes; ComponentLink1Description: Datasheet; ComponentLink1URL: https://wmsc.lcsc.com/wmsc/upload/file/pdf/v2/lcsc/1811081551_Murata-Electronics-GCM1555C1H100FA16D_C161145.pdf; ComponentLink2Description: JLCPCB Part URL; ComponentLink2URL: https://jlcpcb.com/partdetail/C161145; ComponentLink3Description: LCSC Part URL; ComponentLink3URL: https://lcsc.com/product-detail/Multilayer-Ceramic-Capacitors-MLCC---SMD-SMT_Murata-Electronics-Murata-Electronics-GCM1555C1H100FA16D_C161145.html
footprint CAP-0402 (0402 (1005M) Capacitor)
pins: 1, 2

## GCM1555C1H100GA16D
designator C?  Capacitance: 10pF  (hidden comment: *)
Capacitor, Ceramic (MLCC), 10pF, ±2%, null, ±2%, SMD 0402; Manufacturer: Murata Electronics; Manufacturer Part Number: GCM1555C1H100GA16D; Package Size: 0402; JLCPCB Basic Part: No; JLCPCB Part Number: C882584; Supplier 1: LCSC; Category: Capacitors - MLCC; Supplier Part Number 1: C882584; Tolerance: ±2%; Voltage Rating: null; RoHS: Yes; ComponentLink1Description: Datasheet; ComponentLink1URL: https://wmsc.lcsc.com/wmsc/upload/file/pdf/v2/lcsc/2301041009_Murata-Electronics-GCM1555C1H100GA16D_C882584.pdf; ComponentLink2Description: JLCPCB Part URL; ComponentLink2URL: https://jlcpcb.com/partdetail/C882584; ComponentLink3Description: LCSC Part URL; ComponentLink3URL: https://lcsc.com/product-detail/Multilayer-Ceramic-Capacitors-MLCC---SMD-SMT_Murata-Electronics-Murata-Electronics-GCM1555C1H100GA16D_C882584.html
footprint CAP-0402 (0402 (1005M) Capacitor)
pins: 1, 2

## GCM1555C1H100JA16D
designator C?  Capacitance: 10pF  (hidden comment: *)
Capacitor, Ceramic (MLCC), 10pF, ±5%, 50V, C0G, ±5%, SMD 0402; Manufacturer: Murata Electronics; Manufacturer Part Number: GCM1555C1H100JA16D; Package Size: 0402; JLCPCB Basic Part: No; JLCPCB Part Number: C126491; Supplier 1: LCSC; Category: Capacitors - MLCC; Supplier Part Number 1: C126491; Tolerance: ±5%; Voltage Rating: 50V; Temperature Coefficient: C0G; RoHS: Yes; ComponentLink1Description: Datasheet; ComponentLink1URL: https://wmsc.lcsc.com/wmsc/upload/file/pdf/v2/lcsc/1811081516_Murata-Electronics-GCM1555C1H100JA16D_C126491.pdf; ComponentLink2Description: JLCPCB Part URL; ComponentLink2URL: https://jlcpcb.com/partdetail/C126491; ComponentLink3Description: LCSC Part URL; ComponentLink3URL: https://lcsc.com/product-detail/Multilayer-Ceramic-Capacitors-MLCC---SMD-SMT_Murata-Electronics-Murata-Electronics-GCM1555C1H100JA16D_C126491.html
footprint CAP-0402 (0402 (1005M) Capacitor)
pins: 1, 2

## GCM1555C1H101FA16D
designator C?  Capacitance: 100pF  (hidden comment: *)
Capacitor, Ceramic (MLCC), 100pF, ±1%, 50V, C0G, ±1%, SMD 0402; Manufacturer: Murata Electronics; Manufacturer Part Number: GCM1555C1H101FA16D; Package Size: 0402; JLCPCB Basic Part: No; JLCPCB Part Number: C2941926; Supplier 1: LCSC; Category: Capacitors - MLCC; Supplier Part Number 1: C2941926; Tolerance: ±1%; Voltage Rating: 50V; Temperature Coefficient: C0G; RoHS: Yes; ComponentLink1Description: Datasheet; ComponentLink1URL: https://wmsc.lcsc.com/wmsc/upload/file/pdf/v2/lcsc/2201121900_Murata-Electronics-GCM1555C1H101FA16D_C2941926.pdf; ComponentLink2Description: JLCPCB Part URL; ComponentLink2URL: https://jlcpcb.com/partdetail/C2941926; ComponentLink3Description: LCSC Part URL; ComponentLink3URL: https://lcsc.com/product-detail/Multilayer-Ceramic-Capacitors-MLCC---SMD-SMT_Murata-Electronics-Murata-Electronics-GCM1555C1H101FA16D_C2941926.html
footprint CAP-0402 (0402 (1005M) Capacitor)
pins: 1, 2

## GCM1555C1H101GA16D
designator C?  Capacitance: 100pF  (hidden comment: *)
Capacitor, Ceramic (MLCC), 100pF, ±2%, 50V, C0G, ±2%, SMD 0402; Manufacturer: Murata Electronics; Manufacturer Part Number: GCM1555C1H101GA16D; Package Size: 0402; JLCPCB Basic Part: No; JLCPCB Part Number: C1864226; Supplier 1: LCSC; Category: Capacitors - MLCC; Supplier Part Number 1: C1864226; Tolerance: ±2%; Voltage Rating: 50V; Temperature Coefficient: C0G; RoHS: Yes; ComponentLink1Description: Datasheet; ComponentLink1URL: https://wmsc.lcsc.com/wmsc/upload/file/pdf/v2/lcsc/2201271800_Murata-Electronics-GCM1555C1H101GA16D_C1864226.pdf; ComponentLink2Description: JLCPCB Part URL; ComponentLink2URL: https://jlcpcb.com/partdetail/C1864226; ComponentLink3Description: LCSC Part URL; ComponentLink3URL: https://lcsc.com/product-detail/Multilayer-Ceramic-Capacitors-MLCC---SMD-SMT_Murata-Electronics-Murata-Electronics-GCM1555C1H101GA16D_C1864226.html
footprint CAP-0402 (0402 (1005M) Capacitor)
pins: 1, 2

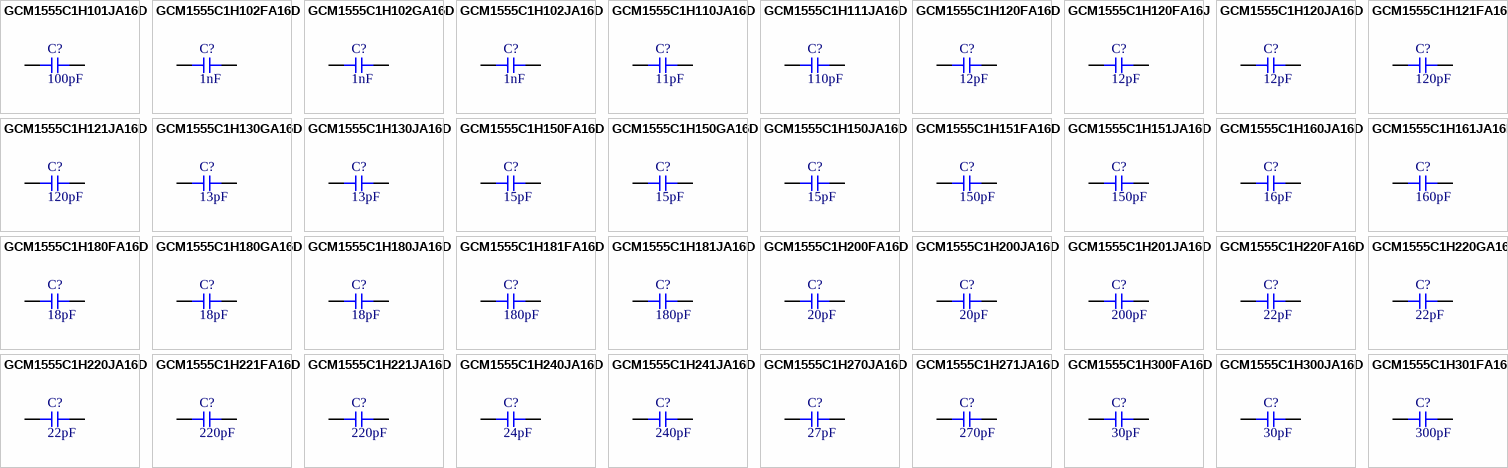
[diagram p59: symbols GCM1555C1H101JA16D to GCM1555C1H301FA16D]

## GCM1555C1H101JA16D
designator C?  Capacitance: 100pF  (hidden comment: *)
Capacitor, Ceramic (MLCC), 100pF, ±5%, 50V, C0G, ±5%, SMD 0402; Manufacturer: Murata Electronics; Manufacturer Part Number: GCM1555C1H101JA16D; Package Size: 0402; JLCPCB Basic Part: No; JLCPCB Part Number: C126492; Supplier 1: LCSC; Category: Capacitors - MLCC; Supplier Part Number 1: C126492; Tolerance: ±5%; Voltage Rating: 50V; Temperature Coefficient: C0G; RoHS: Yes; ComponentLink1Description: Datasheet; ComponentLink1URL: https://wmsc.lcsc.com/wmsc/upload/file/pdf/v2/lcsc/1811081510_Murata-Electronics-GCM1555C1H101JA16D_C126492.pdf; ComponentLink2Description: JLCPCB Part URL; ComponentLink2URL: https://jlcpcb.com/partdetail/C126492; ComponentLink3Description: LCSC Part URL; ComponentLink3URL: https://lcsc.com/product-detail/Multilayer-Ceramic-Capacitors-MLCC---SMD-SMT_Murata-Electronics-Murata-Electronics-GCM1555C1H101JA16D_C126492.html
footprint CAP-0402 (0402 (1005M) Capacitor)
pins: 1, 2

## GCM1555C1H102FA16D
designator C?  Capacitance: 1nF  (hidden comment: *)
Capacitor, Ceramic (MLCC), 1nF, ±1%, 50V, C0G, ±1%, SMD 0402; Manufacturer: Murata Electronics; Manufacturer Part Number: GCM1555C1H102FA16D; Package Size: 0402; JLCPCB Basic Part: No; JLCPCB Part Number: C126493; Supplier 1: LCSC; Category: Capacitors - MLCC; Supplier Part Number 1: C126493; Tolerance: ±1%; Voltage Rating: 50V; Temperature Coefficient: C0G; RoHS: Yes; ComponentLink1Description: Datasheet; ComponentLink1URL: https://wmsc.lcsc.com/wmsc/upload/file/pdf/v2/lcsc/1811081533_Murata-Electronics-GCM1555C1H102FA16D_C126493.pdf; ComponentLink2Description: JLCPCB Part URL; ComponentLink2URL: https://jlcpcb.com/partdetail/C126493; ComponentLink3Description: LCSC Part URL; ComponentLink3URL: https://lcsc.com/product-detail/Multilayer-Ceramic-Capacitors-MLCC---SMD-SMT_Murata-Electronics-Murata-Electronics-GCM1555C1H102FA16D_C126493.html
footprint CAP-0402 (0402 (1005M) Capacitor)
pins: 1, 2

## GCM1555C1H102GA16D
designator C?  Capacitance: 1nF  (hidden comment: *)
Capacitor, Ceramic (MLCC), 1nF, ±2%, 50V, C0G, ±2%, SMD 0402; Manufacturer: Murata Electronics; Manufacturer Part Number: GCM1555C1H102GA16D; Package Size: 0402; JLCPCB Basic Part: No; JLCPCB Part Number: C126494; Supplier 1: LCSC; Category: Capacitors - MLCC; Supplier Part Number 1: C126494; Tolerance: ±2%; Voltage Rating: 50V; Temperature Coefficient: C0G; RoHS: Yes; ComponentLink1Description: Datasheet; ComponentLink1URL: https://wmsc.lcsc.com/wmsc/upload/file/pdf/v2/lcsc/1811081516_Murata-Electronics-GCM1555C1H102GA16D_C126494.pdf; ComponentLink2Description: JLCPCB Part URL; ComponentLink2URL: https://jlcpcb.com/partdetail/C126494; ComponentLink3Description: LCSC Part URL; ComponentLink3URL: https://lcsc.com/product-detail/Multilayer-Ceramic-Capacitors-MLCC---SMD-SMT_Murata-Electronics-Murata-Electronics-GCM1555C1H102GA16D_C126494.html
footprint CAP-0402 (0402 (1005M) Capacitor)
pins: 1, 2

## GCM1555C1H102JA16D
designator C?  Capacitance: 1nF  (hidden comment: *)
Capacitor, Ceramic (MLCC), 1nF, ±5%, 50V, C0G, ±5%, SMD 0402; Manufacturer: Murata Electronics; Manufacturer Part Number: GCM1555C1H102JA16D; Package Size: 0402; JLCPCB Basic Part: No; JLCPCB Part Number: C437434; Supplier 1: LCSC; Category: Capacitors - MLCC; Supplier Part Number 1: C437434; Tolerance: ±5%; Voltage Rating: 50V; Temperature Coefficient: C0G; RoHS: Yes; ComponentLink1Description: Datasheet; ComponentLink1URL: https://wmsc.lcsc.com/wmsc/upload/file/pdf/v2/lcsc/2304140030_Murata-Electronics-GCM1555C1H102JA16D_C437434.pdf; ComponentLink2Description: JLCPCB Part URL; ComponentLink2URL: https://jlcpcb.com/partdetail/C437434; ComponentLink3Description: LCSC Part URL; ComponentLink3URL: https://lcsc.com/product-detail/Multilayer-Ceramic-Capacitors-MLCC---SMD-SMT_Murata-Electronics-Murata-Electronics-GCM1555C1H102JA16D_C437434.html
footprint CAP-0402 (0402 (1005M) Capacitor)
pins: 1, 2

## GCM1555C1H110JA16D
designator C?  Capacitance: 11pF  (hidden comment: *)
Capacitor, Ceramic (MLCC), 11pF, ±5%, 50V, C0G, ±5%, SMD 0402; Manufacturer: Murata Electronics; Manufacturer Part Number: GCM1555C1H110JA16D; Package Size: 0402; JLCPCB Basic Part: No; JLCPCB Part Number: C710643; Supplier 1: LCSC; Category: Capacitors - MLCC; Supplier Part Number 1: C710643; Tolerance: ±5%; Voltage Rating: 50V; Temperature Coefficient: C0G; RoHS: Yes; ComponentLink1Description: Datasheet; ComponentLink1URL: https://wmsc.lcsc.com/wmsc/upload/file/pdf/v2/lcsc/2201111430_Murata-Electronics-GCM1555C1H110JA16D_C710643.pdf; ComponentLink2Description: JLCPCB Part URL; ComponentLink2URL: https://jlcpcb.com/partdetail/C710643; ComponentLink3Description: LCSC Part URL; ComponentLink3URL: https://lcsc.com/product-detail/Multilayer-Ceramic-Capacitors-MLCC---SMD-SMT_Murata-Electronics-Murata-Electronics-GCM1555C1H110JA16D_C710643.html
footprint CAP-0402 (0402 (1005M) Capacitor)
pins: 1, 2

## GCM1555C1H111JA16D
designator C?  Capacitance: 110pF  (hidden comment: *)
Capacitor, Ceramic (MLCC), 110pF, ±5%, 50V, C0G, ±5%, SMD 0402; Manufacturer: Murata Electronics; Manufacturer Part Number: GCM1555C1H111JA16D; Package Size: 0402; JLCPCB Basic Part: No; JLCPCB Part Number: C710644; Supplier 1: LCSC; Category: Capacitors - MLCC; Supplier Part Number 1: C710644; Tolerance: ±5%; Voltage Rating: 50V; Temperature Coefficient: C0G; RoHS: Yes; ComponentLink1Description: Datasheet; ComponentLink1URL: https://wmsc.lcsc.com/wmsc/upload/file/pdf/v2/lcsc/2201111430_Murata-Electronics-GCM1555C1H111JA16D_C710644.pdf; ComponentLink2Description: JLCPCB Part URL; ComponentLink2URL: https://jlcpcb.com/partdetail/C710644; ComponentLink3Description: LCSC Part URL; ComponentLink3URL: https://lcsc.com/product-detail/Multilayer-Ceramic-Capacitors-MLCC---SMD-SMT_Murata-Electronics-Murata-Electronics-GCM1555C1H111JA16D_C710644.html
footprint CAP-0402 (0402 (1005M) Capacitor)
pins: 1, 2
